# Altium footprint library through.PcbLib: 30 footprints (part 1 of 2)
Each footprint in its own frame and in the unit in brackets; x right, y up, seen from the top. Pads: shape width x height; smd on the part's side, far side on the other; paste and mask are expansions set on the pad; w line width, h text height; cw(c..) or ccw(c..) is an arc to the next point about the centre after c.
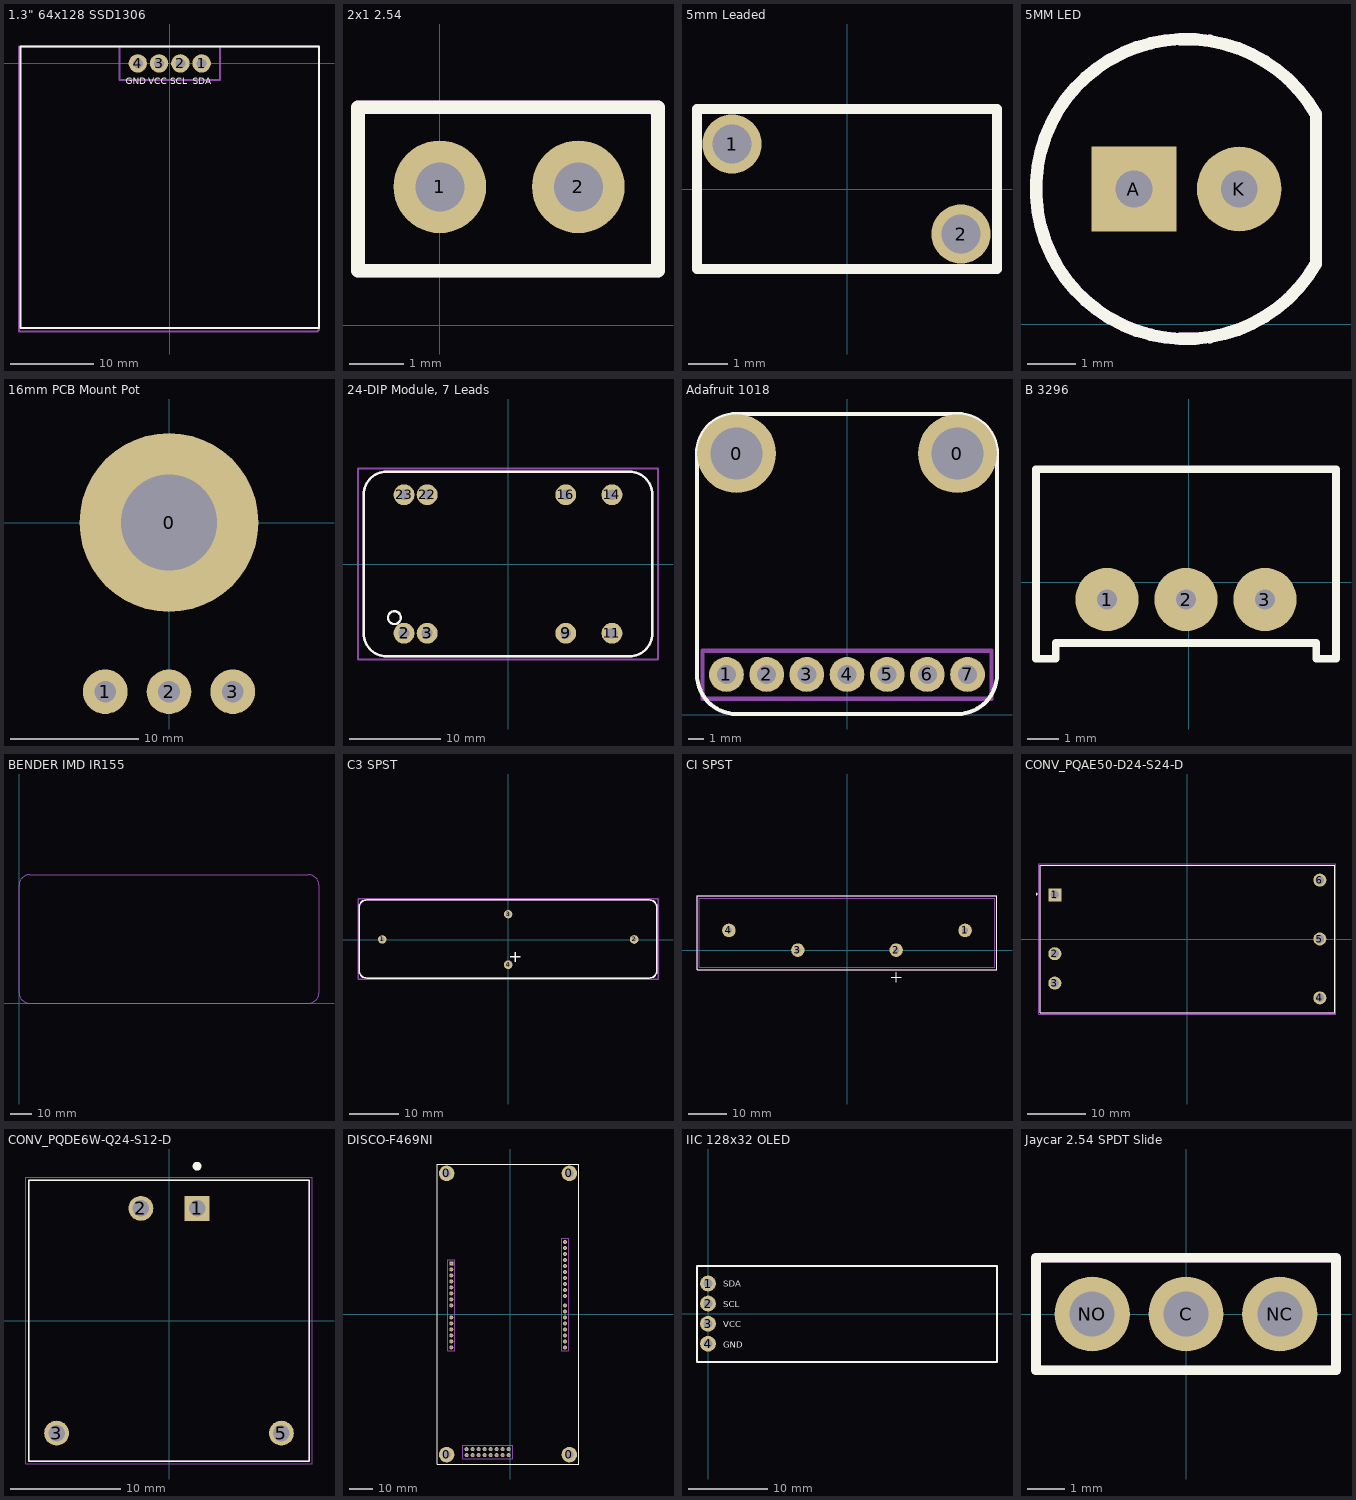
[diagram p0: the footprints below, top view; thin cyan lines are the x and y axes]

## 1.3" 64x128 SSD1306 [mm]
pads (4):
  round 2.2 hole 1.2 unplated: 1(3.81,0) 2(1.27,0) 3(-1.27,0) 4(-3.81,0)
Top Overlay:
  lines w0.254: -17.825,-31.6 -17.825,2 17.825,2 17.825,-31.6 -17.825,-31.6
  text "SDA" at 2.75,-2.5 h0.8
  text "SCL" at 0.083,-2.5 h0.8
  text "VCC" at -2.583,-2.5 h0.8
  text "GND" at -5.25,-2.5 h0.8
Mechanical 13:
  lines w0.254: -6,-2 -6,2 6,2 6,-2 -6,-2
Mechanical 15:
  lines w0.254: -18,2 -18,-32 17.65,-32 17.825,-31.825 17.825,2 -17.825,2
3D body: height 0.25, standoff 0, extent -17.825,-31.6 17.825,2

## 2x1 2.54 [mm]
pads (2):
  round 1.7 hole 0.9: 1(0,2.54) 2(2.54,2.54)
Top Overlay:
  lines w0.254: -1.5,1 4,1 4,4 -1.5,4 -1.5,1
Mechanical 13:
  lines w0.254: -1.5,1 4,1 4,3.9 3.9,4 -1.5,4 -1.5,1
Mechanical 15:
  lines w0.254: -1.5,1 4,1 4,4 -1.5,4 -1.5,1

## 5mm Leaded [mm]
height 10
pads (2):
  round 1.5 hole 1: 1(-2.921,1.143) 2(2.896,-1.143)
Top Overlay:
  lines w0.254: -3.81,-2.032 3.81,-2.032 3.81,2.032 -3.81,2.032 -3.81,-2.032
Mechanical 13:
  lines w0.254: -3.81,-2.032 3.81,-2.032 3.81,2.032 -3.81,2.032 -3.81,-2.032
Mechanical 15:
  lines w0.254: -3.81,-2.032 3.81,-2.032 3.81,2.032 -3.81,2.032 -3.81,-2.032
3D body "5mm leaded.step": height 0, standoff -5.21, extent -3.366,-1.586 3.362,1.587
3D body: height -2, standoff -8, extent -3.581,-0.762 3.48,0.889

## 5MM LED [mm]
pads (2):
  rect 1.75x1.75 hole 0.762: A(8.725,2.8)
  round 1.75 hole 0.762: K(10.9,2.8)
Top Overlay:
  lines w0.254: 12.485,1.25 cw(c9.8,2.8) 12.485,4.35 12.485,1.25
Mechanical 15:
  lines w0.254: 12.485,1.25 cw(c9.8,2.8) 12.485,4.35
3D body "LED, 5mm, red v4.step": height 8.9, standoff -28, extent 6.85,-0.149 12.363,5.749

## 16mm PCB Mount Pot [mm]
pads (4):
  round 14 hole 7.5: 0(0,0)
  round 3.5 hole 1.7: 1(-5,-13.25) 2(0,-13.25) 3(5,-13.25)
Bottom Overlay:
  circle w0.254: c0,0 r8.5
  lines w0.254: -8.25,-2.25 -8.25,-13 8.25,-13 8.25,-2.25
  text "16MM" at -1.5,-7.75 h0.8
3D body "47K Potenziometer.step": height 18.2, standoff -10, extent -8.125,-16.25 8.125,8.3

## 24-DIP Module, 7 Leads [mm]
pads (8):
  round 2.3 hole 1.2: 2(-11.43,-7.62) 3(-8.89,-7.62) 9(6.35,-7.62) 11(11.43,-7.62) 14(11.43,7.62) 16(6.35,7.62) 22(-8.89,7.62) 23(-11.43,7.62)
Top Overlay:
  circle w0.254: c-12.5,-5.9 r0.707
  lines w0.254: -15.875,-7.62 ccw(c-13.335,-7.62) -13.335,-10.16 13.335,-10.16 ccw(c13.335,-7.62) 15.875,-7.62 15.875,7.62 ccw(c13.335,7.62) 13.335,10.16 -13.335,10.16 ccw(c-13.335,7.62) -15.875,7.62 -15.875,-7.62
Mechanical 13:
  lines w0.254: -15.875,-7.62 ccw(c-13.335,-7.62) -13.335,-10.16 13.335,-10.16 ccw(c13.335,-7.62) 15.875,-7.62 15.875,7.62 ccw(c13.335,7.62) 13.335,10.16 -13.335,10.16 ccw(c-13.335,7.62) -15.875,7.62 -15.875,-7.62
Mechanical 15:
  lines w0.254: -16.5,-10.5 -16.5,10.5 16.5,10.5 16.5,-10.5 -16.5,-10.5
3D body "JTC.step": height 10.41, standoff 0.25, extent -15.875,-10.16 15.875,10.16

## Adafruit 1018 [mm]
pads (9):
  round 5 hole 3.3: 0(-6.985,16.51) 0(6.985,16.51)
  round 2.2 hole 1.2 unplated: 1(-7.62,2.54) 2(-5.08,2.54) 3(-2.54,2.54) 4(0,2.54) 5(2.54,2.54) 6(5.08,2.54) 7(7.62,2.54)
Top Overlay:
  lines w0.254: -9.485,2.54 ccw(c-6.985,2.54) -6.985,0.04 6.985,0.04 ccw(c6.985,2.54) 9.485,2.54 9.485,16.51 ccw(c6.985,16.51) 6.985,19.01 -6.985,19.01 ccw(c-6.985,16.51) -9.485,16.51 -9.485,2.54
Mechanical 13:
  lines w0.254: -9.144,1.016 -9.144,4.064 9.144,4.064 9.144,1.016 -9.144,1.016
Mechanical 15:
  lines w0.254: -9.144,0.976 -9.144,4.024 9.144,4.024 9.144,0.976 -9.144,0.976
3D body "Adafruit Accelerometer PCB.STEP": height 5.9, standoff -4.2, extent -9.55,0.015 9.5,19.065

## B 3296 [mil]
pads (3):
  round 80 hole 25.2: 1(-103.39,-22) 2(-3.39,-22) 3(96.61,-22)
Top Overlay:
  lines w10: -193.39,-97 -168.39,-97 -168.39,-77 161.61,-77 161.61,-97 186.61,-97 186.61,143 -193.39,143 -193.39,-97
3D body "User Library-3299W-1-103RLF.STEP": height 455, standoff -245, extent -190.89,-97 184.11,143

## BENDER IMD IR155 [mm]
Bottom Overlay:
  circle w0.254: c135,5 r5
  circle w0.254: c5,5 r5
  circle w0.254: c135,55 r5
  circle w0.254: c5,55 r5
  circle w0.254: c78.25,5 r4.931
  circle w0.254: c78.25,55 r5
  lines w0.254: 0,5 ccw(c5,5) 5,0 135,0 ccw(c135,5) 140,5 140,55 ccw(c135,55) 135,60 5,60 ccw(c5,55) 0,55 0,5
  text "BENDER IMD IR155" at 130,0 h2.5
  text "HV+" at 35,57.5 h2.5
  text "HV-" at 22.5,57.5 h2.5
Mechanical 15:
  lines w0.254: 0,5 ccw(c5,5) 5,0 135,0 ccw(c135,5) 140,5 140,55 ccw(c135,55) 135,60 5,60 ccw(c5,55) 0,55 0,5
3D body "Bender IR155 IMD.STEP": height -15.8, standoff -32.6, extent 0,0 141.097,59.999

## C3 SPST [mm]
pads (4):
  round 1.7 hole 0.9: 1(-25.37,0.033) 3(0.03,5.133)
  round 1.75 hole 0.9: 2(25.43,0.033) 4(0.03,-5.067)
Top Overlay:
  lines w0.254: 0.5,-3.5 2.5,-3.5 ; 1.5,-4.5 1.5,-2.5 ; -30,-6.25 ccw(c-28.5,-6.25) -28.5,-7.75 28.5,-7.75 ccw(c28.5,-6.25) 30,-6.25 30,6.5 ccw(c28.5,6.5) 28.5,8 -28.5,8 ccw(c-28.5,6.5) -30,6.5 -30,-6.25
Mechanical 13:
  lines w0.254: -30,-6.25 ccw(c-28.5,-6.25) -28.5,-7.75 28.5,-7.75 ccw(c28.5,-6.25) 30,-6.25 30,6.5 ccw(c28.5,6.5) 28.5,8 -28.5,8 ccw(c-28.5,6.5) -30,6.5 -30,-6.25
Mechanical 15:
  lines w0.254: -30.25,-8 -30.25,8.25 30.25,8.25 30.25,-8 -30.25,-8
3D body "59280.stp": height 18.4, standoff -4, extent -29.97,-7.867 30.03,7.933

## CI SPST [mm]
pads (4):
  round 3.5 hole 1.45: 1(30.48,5.08) 2(12.7,0) 3(-12.7,0) 4(-30.48,5.08)
Top Overlay:
  lines w0.254: 11.43,-6.985 12.065,-6.985 13.97,-6.985 ; 12.7,-8.255 12.7,-5.715 ; -38.735,-5.08 -38.735,13.97 38.735,13.97 38.735,-5.08 -38.735,-5.08
Mechanical 13:
  lines w0.254: -38.1,-4.445 -38.1,13.335 38.1,13.335 38.1,-4.445 -38.1,-4.445
Mechanical 15:
  lines w0.254: -38.735,-5.08 -38.735,13.97 38.735,13.97 38.735,-5.08 -38.735,-5.08
3D body: height 20.57, standoff 0, extent -38.1,-4.445 38.1,13.335

## CONV_PQAE50-D24-S24-D [mm]
pads (6):
  rect 2.25x2.25 hole 1.5: 1(-22.86,7.62)
  round 2.25 hole 1.5: 2(-22.86,-2.54) 3(-22.86,-7.62) 4(22.86,-10.16) 5(22.86,0) 6(22.86,10.16)
Top Overlay:
  circle w0.2: c-26,7.75 r0.1
  lines w0.127: -25.4,-12.7 25.4,-12.7 25.4,12.7 -25.4,12.7 -25.4,-12.7
Mechanical 13:
  circle w0.2: c-26,7.75 r0.1
  lines w0.127: -25.4,-12.7 25.4,-12.7 25.4,12.7 -25.4,12.7 -25.4,-12.7
Mechanical 15:
  lines w0.05: -25.65,-12.95 25.65,-12.95 25.65,12.95 -25.65,12.95 -25.65,-12.95

## CONV_PQDE6W-Q24-S12-D [mm]
pads (4):
  rect 2.25x2.25 hole 1.5: 1(2.54,10.16)
  round 2.25 hole 1.5: 2(-2.54,10.16) 3(-10.16,-10.16) 5(10.16,-10.16)
Top Overlay:
  circle w0.4: c2.54,13.97 r0.2
  lines w0.127: -12.7,-12.7 -12.7,12.7 12.7,12.7 12.7,-12.7 -12.7,-12.7
Mechanical 13:
  lines w0.127: -12.7,-12.7 -12.7,12.7 12.7,12.7 12.7,-12.7 -12.7,-12.7
Mechanical 15:
  lines w0.05: -12.95,-12.95 -12.95,12.95 12.95,12.95 12.95,-12.95 -12.95,-12.95

## DISCO-F469NI [mm]
pads (52):
  round 6.6 hole 3.3: 0(-27,-59.5) 0(-27,59.5) 0(25,-59.5) 0(25,59.5)
  rect 1.7x1.7 hole 0.95: 1(-25,21.391)
  round 1.7 hole 0.95: 2(-25,18.851) 3(-25,16.311) 4(-25,13.771) 5(-25,11.231) 6(-25,8.691) 7(-25,6.151) 8(-25,3.611) 9(-25,-1.469) 10(-25,-4.009) 11(-25,-6.549) 12(-25,-9.089) 13(-25,-11.629) 14(-25,-14.169) 15(23.103,30.499) 16(23.103,27.959) 17(23.103,25.419) 18(23.103,22.879) 19(23.103,20.339) 20(23.103,17.799) 21(23.103,15.259) 22(23.103,12.719) 23(23.103,10.179) 24(23.103,7.639) 25(23.103,3.611) 26(23.103,1.071) 27(23.103,-1.469) 28(23.103,-4.009) 29(23.103,-6.549) 30(23.103,-9.089) 31(23.103,-11.629) 32(23.103,-14.169) 33(-0.727,-57.213) 34(-3.267,-57.213) 35(-5.807,-57.213) 36(-8.347,-57.213) 37(-10.887,-57.213) 38(-13.427,-57.213) 39(-15.967,-57.213) 40(-18.558,-57.213) 41(-18.507,-59.753) 42(-15.967,-59.753) 43(-13.427,-59.753) 44(-10.887,-59.753) 45(-8.347,-59.753) 46(-5.807,-59.753) 47(-3.267,-59.753) 48(-0.727,-59.753)
Top Overlay:
  lines w0.254: -31,-63.5 29,-63.5 29,63.5 -31,63.5 -31,-63.5
Mechanical 13:
  lines w0.254: -26.5,-15.609 -26.5,22.891 -23.5,22.891 -23.5,-15.609 -26.5,-15.609 ; -20.25,-61.359 -20.25,-55.609 1,-55.609 1,-61.359 -20.25,-61.359 ; 21.6,-15.609 21.6,31.991 24.6,31.991 24.6,-15.609 21.6,-15.609
3D body "F469IDISCOVERY.STEP": height -0.86, standoff -16.86, extent -31.096,-64.691 29.951,63.885

## IIC 128x32 OLED [mm]
pads (4):
  round 2 hole 1.1: 1(0,3.81) 2(0,1.27) 3(0,-1.27) 4(0,-3.81)
Top Overlay:
  lines w0.254: -1.4,-6.1 -1.4,6 36.6,6 36.6,-6.1 -1.4,-6.1
  text "SDA" at 1.9,3.4 h0.8
  text "SCL" at 1.9,0.833 h0.8
  text "VCC" at 1.9,-1.733 h0.8
  text "GND" at 1.9,-4.3 h0.8
3D body "OLED 128x32 Display.step": height 5.5, standoff -5.7, extent -1.37,-6.1 36.63,5.9

## Jaycar 2.54 SPDT Slide [mm]
pads (3):
  round 2 hole 1.2: C(0,0) NC(2.5,0) NO(-2.5,0)
Top Overlay:
  lines w0.254: -4,-1.5 4,-1.5 4,1.5 -4,1.5 -4,-1.5
Mechanical 13:
  lines w0.254: -4,-1.5 -4,1.5 3.75,1.5 4,1.5 4,-1.5 -4,-1.5
3D body: height 3, standoff 0, extent -4,-1.5 4,1.5
3D body: height 4.3, standoff 0, extent 0.659,-1 2.159,1
3D body: height 0, standoff -2, extent 2.004,-0.499 3,0.499
3D body: height 0, standoff -2, extent -0.496,-0.499 0.5,0.499
3D body: height 0, standoff -2, extent -2.996,-0.499 -2,0.499